# Altium footprint library ESP32-WROOM_38Pins.PcbLib: 1 footprints
Each footprint in its own frame and in the unit in brackets; x right, y up, seen from the top. Pads: shape width x height; smd on the part's side, far side on the other; paste and mask are expansions set on the pad; w line width, h text height; cw(c..) or ccw(c..) is an arc to the next point about the centre after c.
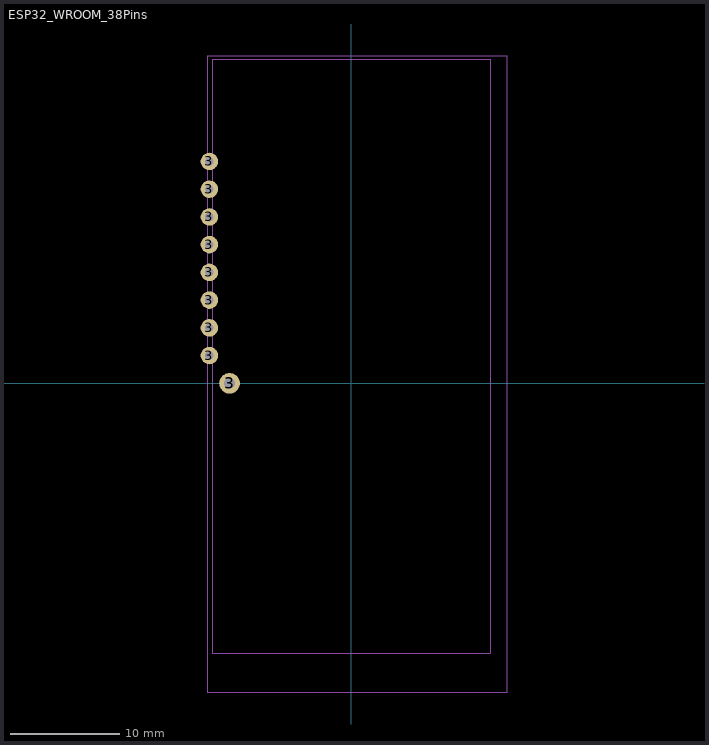
[diagram p0: the footprint, top view; thin cyan lines are the x and y axes]

## ESP32_WROOM_38Pins [mm]
height 0.7
pads (9):
  round 1.6 hole 0.8: 3(-13,2.54) 3(-13,5.08) 3(-13,7.62) 3(-13,10.16) 3(-13,12.7) 3(-13,15.24) 3(-13,17.78) 3(-13,20.32)
  round 1.9 hole 1: 3(-11.15,0)
Top Assembly:
  lines w0.1: -12.75,-24.73 -12.75,29.67 12.75,29.67 12.75,-24.73 -12.75,-24.73
Top Courtyard:
  lines w0.05: -13.2,-28.3 14.3,-28.3 14.3,30 -13.2,30 -13.2,-28.3
Top Designator:
  text ".Designator" at -2.999,-0.2 h0.6
3D body "ESP32-WROVER-DEVKIT-NODEMCU-V1.3.step": height 8.34, standoff -5.89, extent -12.75,-24.73 12.75,29.67